# Altium footprint library Emirhan's.PcbLib: 51 footprints (part 2 of 4)
Each footprint in its own frame and in the unit in brackets; x right, y up, seen from the top. Pads: shape width x height; smd on the part's side, far side on the other; paste and mask are expansions set on the pad; w line width, h text height; cw(c..) or ccw(c..) is an arc to the next point about the centre after c.
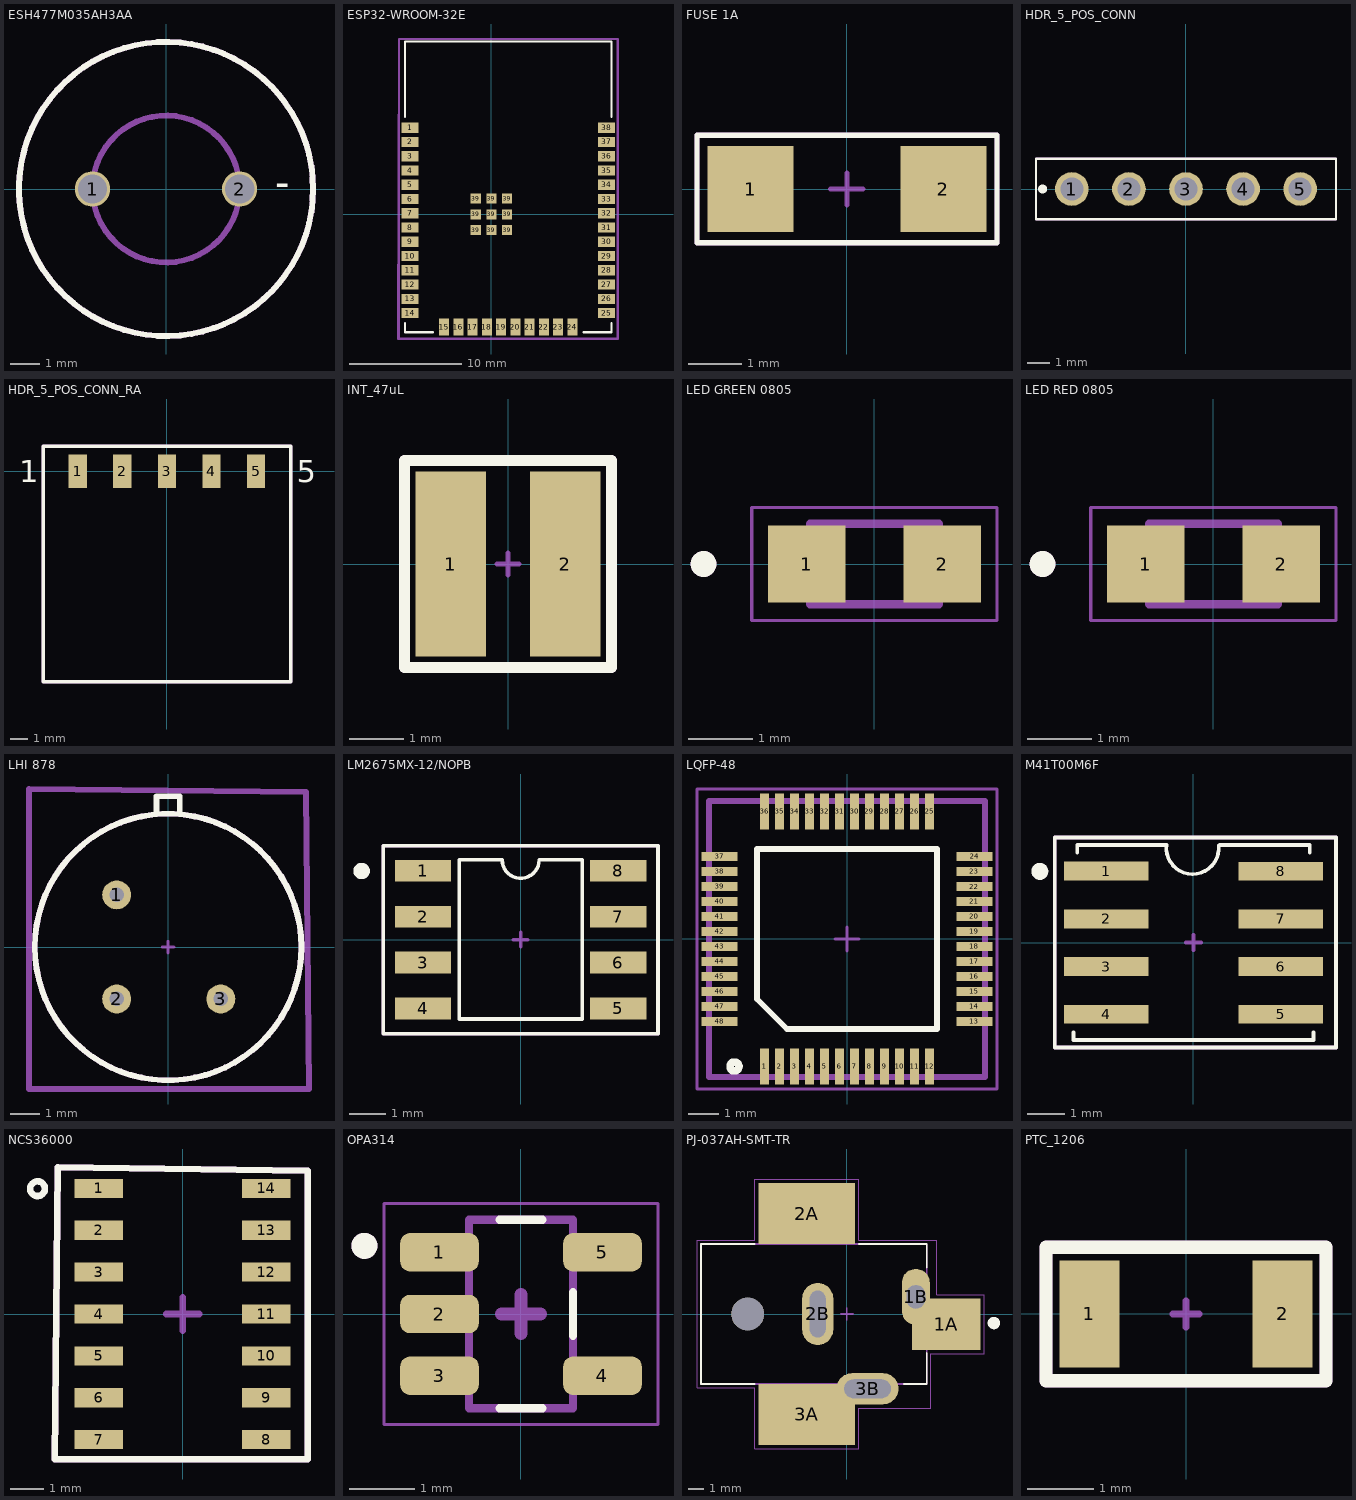
[diagram p1: the footprints below, top view; thin cyan lines are the x and y axes]

## ESH477M035AH3AA [mm]
pads (2):
  round 1.2 hole 1 mask+0.05: 1(-2.5,0) 2(2.5,0)
Top Overlay:
  circle w0.2: c0,0 r5
  text "-" at 4.2,0.5 h1
Top 3D Body:
  circle w0.2: c0,0 r5
Top Designator:
  circle w0.2: c0,0 r2.5
  circle w0.2: c0,0 r5
  text ".Designator" at -1,-1.333 h0.8
3D body "ESH477M050AL3AA.step": height 25, standoff -17, extent -6.75,-6.75 6.75,6.75

## ESP32-WROOM-32E [mm]
pads (47):
  rect 1.5x0.9 smd mask+0.05: 1(-7.25,7.72) 2(-7.25,6.45) 3(-7.25,5.18) 4(-7.25,3.91) 5(-7.25,2.64) 6(-7.25,1.37) 7(-7.25,0.1) 8(-7.25,-1.17) 9(-7.25,-2.44) 10(-7.25,-3.71) 11(-7.25,-4.98) 12(-7.25,-6.25) 13(-7.25,-7.52) 14(-7.25,-8.79) 25(10.25,-8.79) 26(10.25,-7.52) 27(10.25,-6.25) 28(10.25,-4.98) 29(10.25,-3.71) 30(10.25,-2.44) 31(10.25,-1.17) 32(10.25,0.1) 33(10.25,1.37) 34(10.25,2.64) 35(10.25,3.91) 36(10.25,5.18) 37(10.25,6.45) 38(10.25,7.72)
  rect 0.9x1.5 smd mask+0.05: 15(-4.215,-10.04) 16(-2.945,-10.04) 17(-1.675,-10.04) 18(-0.405,-10.04) 19(0.865,-10.04) 20(2.135,-10.04) 21(3.405,-10.04) 22(4.675,-10.04) 23(5.945,-10.04) 24(7.215,-10.04)
  rect 0.9x0.9 smd mask+0.05: 39(-1.4,-1.4) 39(-1.4,0) 39(-1.4,1.4) 39(0,-1.4) 39(0,0) 39(0,1.4) 39(1.4,-1.4) 39(1.4,0) 39(1.4,1.4)
Top Overlay:
  lines w0.2: -7.7,-9.7 -7.7,-10.5 -5.2,-10.5 ; -7.7,8.7 -7.7,15.4 ; -7.65,15.4 10.7,15.4 10.7,8.7 ; 8.2,-10.5 10.7,-10.5 10.7,-9.7
Top 3D Body:
  lines w0.2: -8.3,-11.1 11.25,-11.075 11.25,15.625 -8.225,15.625 -8.3,-11.1
Top Designator:
  lines w0.2: -8.225,-11.075 -8.225,-7.425 -8.225,15.625 11.25,15.625 11.25,-11.075 -8.225,-11.075
  text ".Designator" at -0.7,2.933 h1
3D body "ESP32-WROOM-32E-N4.STEP": height 3.25, standoff 0, extent -7.5,-10.3 10.5,15.2

## FUSE 1A [mm]
pads (2):
  rect 1.6x1.6 smd mask+0.05: 1(-1.8,0) 2(1.8,0)
Top Overlay:
  lines w0.1: -2.8,-1 2.8,-1 2.8,1 -2.8,1 -2.8,-1
Top 3D Body:
  lines w0.1: -2.8,-1 2.8,-1 2.8,1 -2.8,1 -2.8,-1
Top Component Center:
  lines w0.1: -0.3,0 0.3,0 ; 0,-0.3 0,0.3 ; -2.8,-1 2.8,-1 2.8,1 -2.8,1 -2.8,-1
Top Designator:
  lines w0.1: -2.8,-1 2.8,-1 2.8,1 -2.8,1 -2.8,-1
  text ".Designator" at -0.7,-0.733 h0.5
3D body "3413.0216.22.STEP": height 0.6, standoff 0, extent -1.6,-0.8 1.6,0.8

## HDR_5_POS_CONN [mm]
pads (5):
  round 1.5 hole 1.02 mask+0.05: 1(-5.08,0) 2(-2.54,0) 3(0,0) 4(2.54,0) 5(5.08,0)
Top Overlay:
  circle w0.2: c-6.38,0 r0.1
  lines w0.1: -6.675,-1.35 6.675,-1.35 6.675,1.35 -6.675,1.35 -6.675,-1.35
Top 3D Body:
  lines w0.1: -6.675,-1.35 -6.675,1.35 6.675,1.35 6.675,-1.35 -6.675,-1.35
Top Component Center:
  lines w0.1: -6.675,-1.35 -6.675,1.35 6.675,1.35 6.675,-1.35 -6.675,-1.35
Top Designator:
  lines w0.1: -6.675,-1.35 6.675,-1.35 6.675,1.35 -6.675,1.35 -6.675,-1.35
  text ".Designator" at -1.85,0.492 h0.8
3D body "PPTC051LFBN-RC--3DModel-STEP-269445.STEP": height 8.51, standoff -3.2, extent -6.604,-1.27 6.604,1.27

## HDR_5_POS_CONN_RA [mm]
pads (5):
  rect 1.04x1.91 smd mask+0: 1(-5.08,0) 2(-2.54,0) 3(0,0) 4(2.54,0) 5(5.08,0)
Top Overlay:
  lines w0.2: -7.054,-11.982 7.054,-11.982 7.054,1.406 -7.054,1.406 -7.054,-11.982
  text "1" at -8.424,-0.635 h1.27
  text "5" at 7.395,-0.635 h1.27
Top Paste:
  region: -4.56,-0.955 -5.6,-0.955 -5.6,0.955 -4.56,0.955
  region: -2.02,-0.955 -3.06,-0.955 -3.06,0.955 -2.02,0.955
  region: 0.52,-0.955 -0.52,-0.955 -0.52,0.955 0.52,0.955
  region: 3.06,-0.955 2.02,-0.955 2.02,0.955 3.06,0.955
  region: 5.6,-0.955 4.56,-0.955 4.56,0.955 5.6,0.955
Top Solder:
  region: -4.509,-1.006 -5.651,-1.006 -5.651,1.006 -4.509,1.006
  region: -1.969,-1.006 -3.111,-1.006 -3.111,1.006 -1.969,1.006
  region: 0.571,-1.006 -0.571,-1.006 -0.571,1.006 0.571,1.006
  region: 3.111,-1.006 1.969,-1.006 1.969,1.006 3.111,1.006
  region: 5.651,-1.006 4.509,-1.006 4.509,1.006 5.651,1.006
Top 3D Body:
  lines w0.2: -7.054,-11.982 -7.054,1.406 7.054,1.406 7.054,-11.982 -7.054,-11.982
Top Component Center:
  lines w0.1: -0.2,0 0.2,0 ; 0,-0.2 0,0.2
Top Designator:
  lines w0.2: -7.054,-11.982 -7.054,1.406 7.054,1.406 7.054,-11.982 -7.054,-11.982
  text ".Designator" at -1.9,-6.067 h1
Mechanical 13:
  text "1" at -8.424,-0.635 h1.27
  text "5" at 7.395,-0.635 h1.27
3D body "smh-105-02-l-s.stp": height 2.41, standoff -0.01, extent -6.6,-11.509 6.608,0.429

## INT_47uL [mm]
pads (2):
  rect 1.3x3.4 smd mask+0.05: 1(-1.05,0) 2(1.05,0)
Top Overlay:
  lines w0.2: -1.9,-1.9 -1.9,1.9 1.9,1.9 1.9,-1.9 -1.9,-1.9
Top 3D Body:
  lines w0.2: -1.9,-1.9 -1.9,1.9 1.9,1.9 1.9,-1.9 -1.9,-1.9
Top Component Center:
  lines w0.1: -0.2,0 0.2,0 ; 0,-0.2 0,0.2
  lines w0.2: -1.9,-1.9 -1.9,1.9 1.9,1.9 1.9,-1.9 -1.9,-1.9
Top Designator:
  lines w0.2: -1.9,-1.9 -1.9,1.9 1.9,1.9 1.9,-1.9 -1.9,-1.9
  text ".Designator" at -1.6,-0.833 h0.8
3D body: height 0.25, standoff 0, extent -1.5,-1.5 1.5,1.5

## LED GREEN 0805 [mm]
pads (2):
  rect 1.2x1.2 smd: 1(-1.05,0) 2(1.05,0)
Top Overlay:
  circle w0.2: c-2.65,0 r0.1
Mechanical 13:
  circle w0.2: c-2.65,0 r0.1
  lines w0.127: -1,-0.625 -1,0.625 1,0.625 1,-0.625 -1,-0.625
Mechanical 15:
  lines w0.05: -1.9,-0.875 1.9,-0.875 1.9,0.875 -1.9,0.875 -1.9,-0.875
3D body "LTST-C171GKT--3DModel-STEP-510211.STEP": height 0.8, standoff 0, extent -1,-0.625 1,0.625

## LED RED 0805 [mm]
pads (2):
  rect 1.2x1.2 smd: 1(-1.05,0) 2(1.05,0)
Top Overlay:
  circle w0.2: c-2.65,0 r0.1
Mechanical 13:
  circle w0.2: c-2.65,0 r0.1
  lines w0.127: -1,-0.625 -1,0.625 1,0.625 1,-0.625 -1,-0.625
Mechanical 15:
  lines w0.05: -1.9,-0.875 1.9,-0.875 1.9,0.875 -1.9,0.875 -1.9,-0.875
3D body "LTST-C171KRKT.STEP": height 1.1, standoff 0, extent -1,-0.625 1,0.625

## LHI 878 [mm]
pads (3):
  round 1 hole 0.5 mask+0.05: 1(-1.774,1.8) 2(-1.774,-1.792) 3(1.818,-1.792)
Top Overlay:
  circle w0.2: c0,0 r4.6
  lines w0.2: -0.4,4.6 -0.404,5.2 0.404,5.2 0.4,4.6
Top 3D Body:
  circle w0.2: c0,0 r4.6
Top Component Center:
  lines w0.1: -0.2,0 0.2,0 ; 0,-0.2 0,0.2
Top Designator:
  lines w0.2: -4.8,-4.9 -4.8,5.454 4.764,5.353 4.863,-4.9 -4.8,-4.9
  text ".Designator" at -1.9,-0.167 h1
3D body "User Library-LHI878.step": height 4.3, standoff -2.7, extent -4.6,-4.6 4.6,5.029

## LM2675MX-12/NOPB [mm]
pads (8):
  rect 1.55x0.6 smd mask+0.05: 1(-2.7,1.905) 2(-2.7,0.635) 3(-2.7,-0.635) 4(-2.7,-1.905) 5(2.7,-1.905) 6(2.7,-0.635) 7(2.7,0.635) 8(2.7,1.905)
Top Overlay:
  circle w0.254: c-4.4,1.9 r0.1
  lines w0.1: -3.8,-2.6 3.8,-2.6 3.8,2.6 -3.8,2.6 -3.8,-2.6 ; -1.7,-2.195 -1.7,2.205 -0.51,2.205 ccw(c0,2.205) 0.51,2.205 1.7,2.205 1.7,-2.195 -1.7,-2.195
Top 3D Body:
  lines w0.1: -3.8,-2.6 -3.8,2.6 3.8,2.6 3.8,-2.6 -3.8,-2.6
Top Component Center:
  lines w0.1: -0.2,0 0.2,0 ; 0,-0.2 0,0.2
Top Designator:
  lines w0.1: -3.8,-2.6 3.8,-2.6 3.8,2.6 -3.8,2.6 -3.8,-2.6
  text ".Designator" at -0.85,-0.283 h0.8
3D body "LM2675MX-12_NOPB.STEP": height 1.72, standoff -0.03, extent -3,-2.445 3,2.455

## LQFP-48 [mm] "7mm x 7mm"
pads (48):
  rect 0.3x1.2 smd mask+0.05: 1(-2.75,-4.25) 2(-2.25,-4.25) 3(-1.75,-4.25) 4(-1.25,-4.25) 5(-0.75,-4.25) 6(-0.25,-4.25) 7(0.25,-4.25) 8(0.75,-4.25) 9(1.25,-4.25) 10(1.75,-4.25) 11(2.25,-4.25) 12(2.75,-4.25) 25(2.75,4.25) 26(2.25,4.25) 27(1.75,4.25) 28(1.25,4.25) 29(0.75,4.25) 30(0.25,4.25) 31(-0.25,4.25) 32(-0.75,4.25) 33(-1.25,4.25) 34(-1.75,4.25) 35(-2.25,4.25) 36(-2.75,4.25)
  rect 1.2x0.3 smd mask+0.05: 13(4.25,-2.75) 14(4.25,-2.25) 15(4.25,-1.75) 16(4.25,-1.25) 17(4.25,-0.75) 18(4.25,-0.25) 19(4.25,0.25) 20(4.25,0.75) 21(4.25,1.25) 22(4.25,1.75) 23(4.25,2.25) 24(4.25,2.75) 37(-4.25,2.75) 38(-4.25,2.25) 39(-4.25,1.75) 40(-4.25,1.25) 41(-4.25,0.75) 42(-4.25,0.25) 43(-4.25,-0.25) 44(-4.25,-0.75) 45(-4.25,-1.25) 46(-4.25,-1.75) 47(-4.25,-2.25) 48(-4.25,-2.75)
Top Overlay:
  circle w0.25: c-3.75,-4.25 r0.15
  lines w0.2: -3,-2 -3,3 3,3 3,-3 -2,-3 -3,-2
Top 3D Body:
  lines w0.2: -4.6,-4.6 4.6,-4.6 4.6,4.6 -4.6,4.6 -4.6,-4.6
Top Component Center:
  lines w0.1: -0.4,0 0.4,0 ; 0,-0.4 0,0.4 ; -5,-5 -5,5 5,5 5,-5 -5,-5
Top Designator:
  lines w0.1: -5,-5 -5,5 5,5 5,-5 -5,-5
  text ".Designator" at -4.099,-1.667 h0.8
3D body "STM32F103C6T6ATR.STEP": height 1.6, standoff 0, extent -4.5,-4.5 4.5,4.5

## M41T00M6F [mm]
pads (8):
  rect 2.25x0.5 smd mask+0.05: 1(-2.325,1.908) 2(-2.325,0.633) 3(-2.325,-0.637) 4(-2.325,-1.907) 5(2.325,-1.907) 6(2.325,-0.637) 7(2.325,0.633) 8(2.325,1.903)
Top Overlay:
  circle w0.254: c-4.1,1.9 r0.1
  lines w0.1: -3.2,-2.4 -3.2,-2.6 3.2,-2.6 3.2,-2.4 ; -3.1,2.4 -3.1,2.6 -0.725,2.6 ; -0.721,2.602 ccw(c-0.025,2.525) 0.671,2.597 ; 0.7,2.6 3.1,2.6 3.1,2.4 ; -3.7,-2.8 3.8,-2.8 3.8,2.8 -3.7,2.8 -3.7,-2.8
Top 3D Body:
  lines w0.1: -3.7,-2.8 -3.7,2.8 3.8,2.8 3.8,-2.8 -3.7,-2.8
Top Component Center:
  lines w0.1: -0.2,0 0.2,0 ; 0,-0.2 0,0.2 ; -3.7,-2.8 -3.7,2.8 3.8,2.8 3.8,-2.8 -3.7,-2.8
Top Designator:
  lines w0.1: -3.7,-2.8 3.8,-2.8 3.8,2.8 -3.7,2.8 -3.7,-2.8
  text ".Designator" at -1.625,-0.158 h0.8
3D body "M41T00M6F.STEP": height 1.75, standoff 0, extent -3,-2.45 3,2.45

## NCS36000 [mm]
pads (14):
  rect 1.48x0.58 smd mask+0.05: 1(-2.54,3.81) 2(-2.54,2.54) 3(-2.54,1.27) 4(-2.54,0) 5(-2.54,-1.27) 6(-2.54,-2.54) 7(-2.54,-3.81) 8(2.54,-3.81) 9(2.54,-2.54) 10(2.54,-1.27) 11(2.54,0) 12(2.54,1.27) 13(2.54,2.54) 14(2.54,3.81)
Top Overlay:
  circle w0.2: c-4.4,3.8 r0.224
  lines w0.2: -3.88,-4.4 -3.783,4.447 3.8,4.35 3.8,-4.4 -3.88,-4.4
Top 3D Body:
  lines w0.2: -3.88,-4.4 3.8,-4.4 3.8,4.35 -3.783,4.447 -3.88,-4.4
Top Component Center:
  lines w0.2: -0.5,0 0.5,0 ; 0,-0.5 0,0.5 ; -3.88,-4.4 -3.783,4.447 3.8,4.35 3.8,-4.4 -3.88,-4.4
Top Designator:
  lines w0.2: -3.88,-4.4 3.8,-4.4 3.8,4.35 -3.783,4.447 -3.88,-4.4
  text ".Designator" at -1.3,-1.533 h0.8
3D body "NCS36000DRG.step": height 1.83, standoff 0.03, extent -3,-4.28 3,4.28

## OPA314 [mm]
pads (5):
  rrect50% 1.21x0.59 smd: 1(-1.255,0.95) 2(-1.255,0) 3(-1.255,-0.95) 4(1.255,-0.95) 5(1.255,0.95)
Top Overlay:
  circle w0.2: c-2.41,1.05 r0.1
  lines w0.127: -0.33,-1.45 0.33,-1.45 ; -0.33,1.45 0.33,1.45 ; 0.8,-0.335 0.8,0.335
Top 3D Body:
  lines w0.127: -0.8,-1.45 0.8,-1.45 0.8,1.45 -0.8,1.45 -0.8,-1.45
Top Component Center:
  lines w0.05: -2.11,-1.7 2.11,-1.7 2.11,1.7 -2.11,1.7 -2.11,-1.7
  lines w0.2: -0.3,0 0.3,0 ; 0,-0.3 0,0.3
Top Designator:
  lines w0.05: -2.11,-1.7 2.11,-1.7 2.11,1.7 -2.11,1.7 -2.11,-1.7
  text ".Designator" at -0.5,-0.433 h0.8
Mechanical 13:
  circle w0.2: c-2.41,1.05 r0.1
3D body "step_temp.STEP": height 1.41, standoff -0.04, extent -1.4,-1.45 1.4,1.45

## PJ-037AH-SMT-TR [mm]
pads (7):
  rect 4.4x3.3 smd: 1A(6.375,-0.65)
  oval 1.8x3.6 hole 1.2 slot 1.5 at 90 deg: 1B(4.425,1.1)
  rect 6.2x3.9 smd: 2A(-2.575,6.45) 3A(-2.575,-6.45)
  oval 2x4 hole 1 slot 3 at 90 deg: 2B(-1.875,0)
  oval 4x2 hole 1.2 slot 3 at 0 deg: 3B(1.325,-4.8)
  round 2.1 hole 2.1 unplated: ""(-6.375,0)
Top Overlay:
  circle w0.4: c9.435,-0.58 r0.2
  lines w0.127: -5.925,-4.5 -9.375,-4.5 -9.375,4.5 -5.925,4.5 ; 0.775,4.5 5.125,4.5 5.125,3 ; 3.675,-4.5 5.125,-4.5 5.125,-2.5
Top Component Center:
  lines w0.05: -5.95,4.75 -9.625,4.75 -9.625,-4.75 -5.925,-4.75 -5.925,-8.65 0.775,-8.65 0.775,-6.05 5.375,-6.05 5.375,-2.55 8.825,-2.55 8.825,1.25 5.775,1.25 5.775,4.75 ; -5.925,4.75 -5.925,8.65 0.775,8.65 0.775,4.75 5.75,4.75
  lines w0.1: -0.4,0 0.4,0 ; 0,-0.4 0,0.4
Top Designator:
  lines w0.05: -9.625,-4.75 -5.925,-4.75 -5.925,-8.65 0.775,-8.65 0.775,-6.05 5.375,-6.05 5.375,-2.55 8.825,-2.55 8.825,1.25 5.775,1.25 5.775,4.75 0.775,4.75 0.775,8.65 -5.925,8.65 -5.925,4.75 -9.625,4.75 -9.625,-4.75
  text ".Designator" at 0.167,-0.8 h0.4
Mechanical 13:
  lines w0.127: -9.375,-4.5 5.125,-4.5 5.125,4.5 -9.375,4.5 -9.375,-4.5
3D body "User Library-CUI_DEVICES_PJ-037BH-SMT-TR.step": height 11.05, standoff -3.35, extent -9.4,-7.6 7.7,7.6

## PTC_1206 [mm]
pads (2):
  rect 0.9x1.6 smd mask+0.05: 1(-1.45,0) 2(1.45,0)
Top Overlay:
  lines w0.2: -2.1,-1 -2.1,1 2.1,1 2.1,-1 -2.1,-1
Top 3D Body:
  lines w0.2: -2.1,-1 2.1,-1 2.1,1 -2.1,1 -2.1,-1
Top Component Center:
  lines w0.1: -0.2,0 0.2,0 ; 0,-0.2 0,0.2
  lines w0.2: -2.1,-1 -2.1,1 2.1,1 2.1,-1 -2.1,-1
Top Designator:
  lines w0.2: -2.1,-1 -2.1,1 2.1,1 2.1,-1 -2.1,-1
  text ".Designator" at -0.8,-0.633 h0.8
3D body "User Library-RES1206-2.step": height 0.55, standoff 0, extent -1.505,-0.775 1.505,0.775